# Altium footprint library NRF91.PcbLib: 113 footprints (part 4 of 8)
Each footprint in its own frame and in the unit in brackets; x right, y up, seen from the top. Pads: shape width x height; smd on the part's side, far side on the other; paste and mask are expansions set on the pad; w line width, h text height; cw(c..) or ccw(c..) is an arc to the next point about the centre after c.
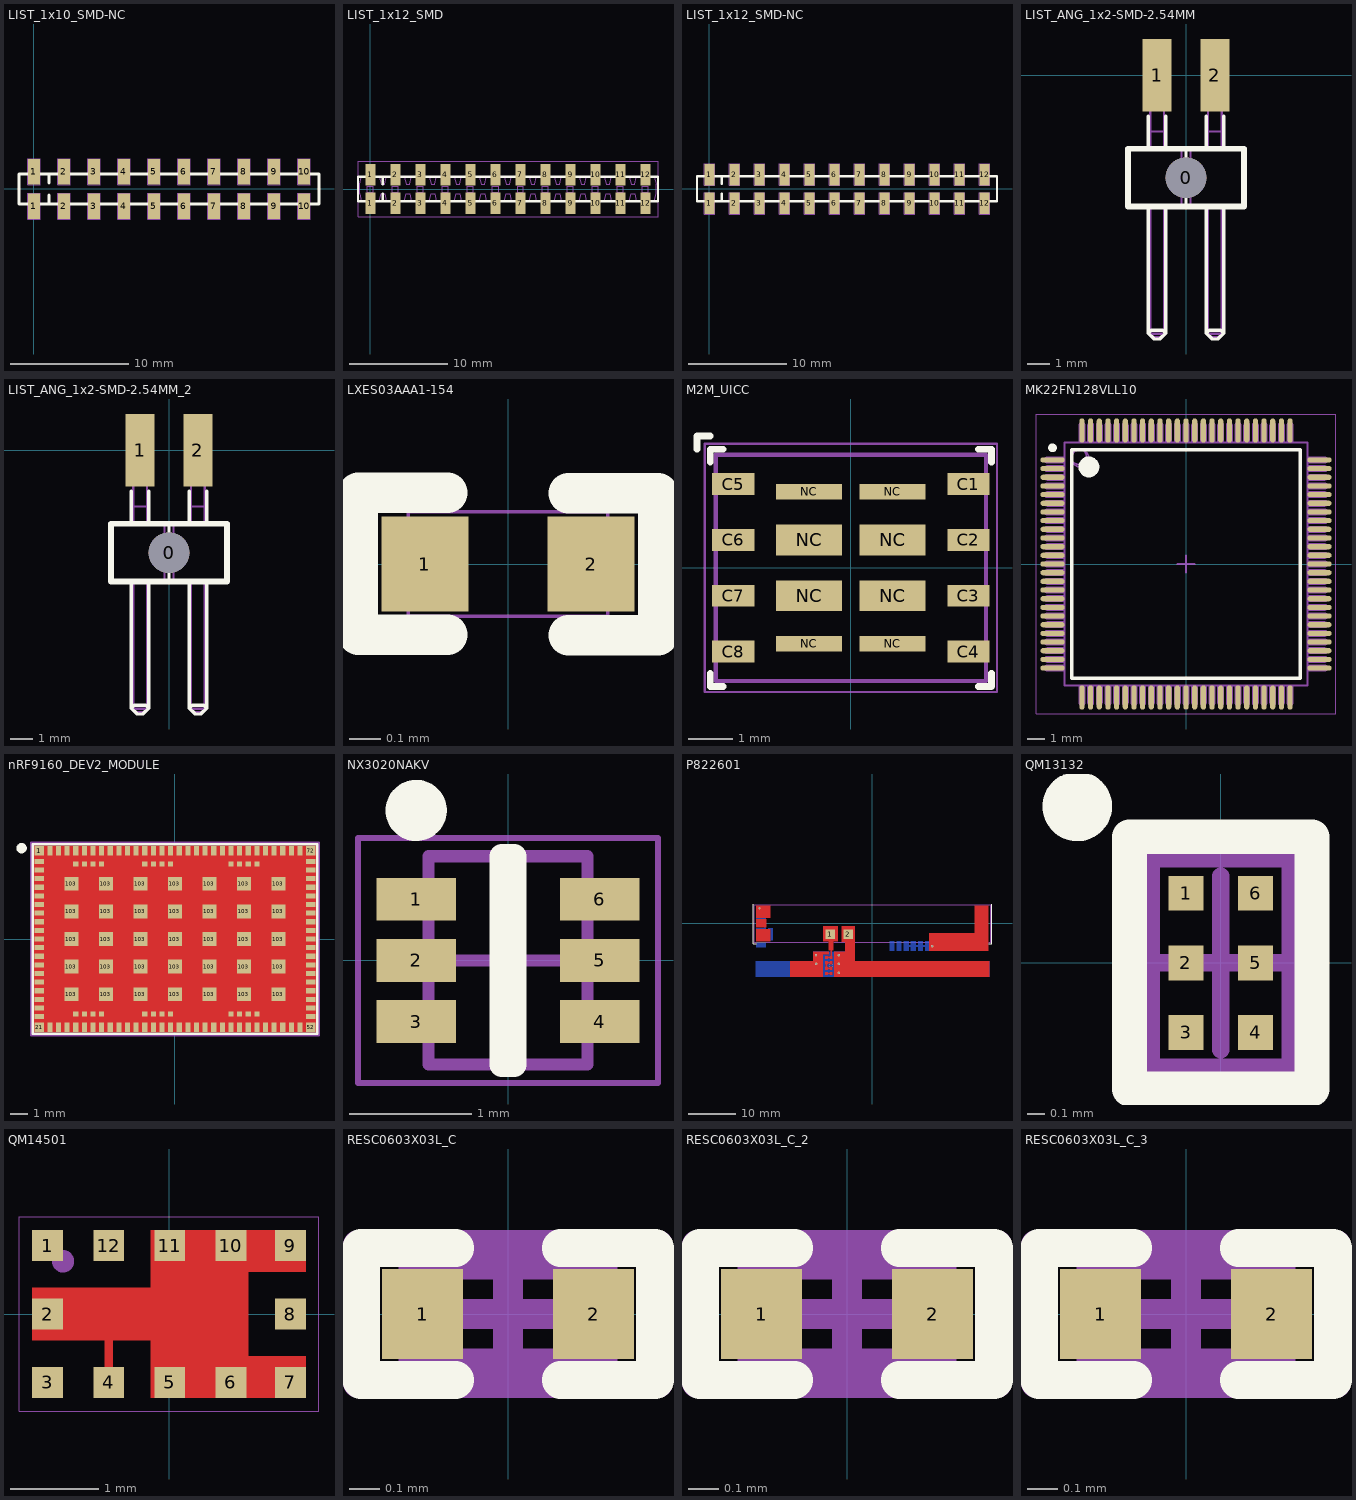
[diagram p3: the footprints below, top view; thin cyan lines are the x and y axes]

## LIST_1x10_SMD-NC [mm]
pads (20):
  rect 1.02x2.19 smd: 1(0,-1.465) 1(0,1.465) 2(2.54,-1.465) 2(2.54,1.465) 3(5.08,-1.465) 3(5.08,1.465) 4(7.62,-1.465) 4(7.62,1.465) 5(10.16,-1.465) 5(10.16,1.465) 6(12.7,-1.465) 6(12.7,1.465) 7(15.24,-1.465) 7(15.24,1.465) 8(17.78,-1.465) 8(17.78,1.465) 9(20.32,-1.465) 9(20.32,1.465) 10(22.86,-1.465) 10(22.86,1.465)
Top Overlay:
  lines w0.254: 1.27,-1.27 1.27,-0.508 ; 1.27,0.508 1.27,1.27 ; -1.27,-1.27 24.13,-1.27 24.13,1.27 -1.27,1.27 -1.27,-1.27
Mechanical 7:
  lines w0.1: -0.686,-1.27 -1.27,-1.27 -1.27,1.27 -0.686,1.27 ; 0.686,-1.27 1.854,-1.27 ; 0.686,1.27 1.854,1.27 ; 1.27,-1.27 1.27,-0.508 ; 1.27,0.508 1.27,1.27 ; 3.226,-1.27 4.394,-1.27 ; 3.226,1.27 4.394,1.27 ; 5.766,-1.27 6.934,-1.27 ; 5.766,1.27 6.934,1.27 ; 8.306,-1.27 9.474,-1.27 ; 8.306,1.27 9.474,1.27 ; 10.846,-1.27 12.014,-1.27 ; 10.846,1.27 12.014,1.27 ; 13.386,-1.27 14.554,-1.27 ; 13.386,1.27 14.554,1.27 ; 15.926,-1.27 17.094,-1.27 ; 15.926,1.27 17.094,1.27 ; 18.466,-1.27 19.634,-1.27 ; 18.466,1.27 19.634,1.27 ; 21.006,-1.27 22.174,-1.27 ; 21.006,1.27 22.174,1.27 ; 23.546,-1.27 24.13,-1.27 24.13,1.27 23.546,1.27 ; -0.51,-2.56 0.51,-2.56 0.51,-0.37 -0.51,-0.37 -0.51,-2.56 ; -0.51,0.37 -0.51,2.56 0.51,2.56 0.51,0.37 -0.51,0.37 ; 2.03,-2.56 3.05,-2.56 3.05,-0.37 2.03,-0.37 2.03,-2.56 ; 2.03,0.37 3.05,0.37 3.05,2.56 2.03,2.56 2.03,0.37 ; 4.57,-2.56 5.59,-2.56 5.59,-0.37 4.57,-0.37 4.57,-2.56 ; 4.57,0.37 5.59,0.37 5.59,2.56 4.57,2.56 4.57,0.37 ; 7.11,-2.56 8.13,-2.56 8.13,-0.37 7.11,-0.37 7.11,-2.56 ; 7.11,0.37 8.13,0.37 8.13,2.56 7.11,2.56 7.11,0.37 ; 9.65,-2.56 10.67,-2.56 10.67,-0.37 9.65,-0.37 9.65,-2.56 ; 9.65,0.37 10.67,0.37 10.67,2.56 9.65,2.56 9.65,0.37 ; 12.19,-2.56 13.21,-2.56 13.21,-0.37 12.19,-0.37 12.19,-2.56 ; 12.19,0.37 13.21,0.37 13.21,2.56 12.19,2.56 12.19,0.37 ; 14.73,-2.56 15.75,-2.56 15.75,-0.37 14.73,-0.37 14.73,-2.56 ; 14.73,0.37 15.75,0.37 15.75,2.56 14.73,2.56 14.73,0.37 ; 17.27,-2.56 18.29,-2.56 18.29,-0.37 17.27,-0.37 17.27,-2.56 ; 17.27,0.37 18.29,0.37 18.29,2.56 17.27,2.56 17.27,0.37 ; 19.81,-2.56 19.81,-0.37 20.83,-0.37 20.83,-2.56 19.81,-2.56 ; 19.81,0.37 19.81,2.56 20.83,2.56 20.83,0.37 19.81,0.37 ; 22.35,-2.56 22.35,-0.37 23.37,-0.37 23.37,-2.56 22.35,-2.56 ; 22.35,0.37 22.35,2.56 23.37,2.56 23.37,0.37 22.35,0.37
  text ".Designator" at 0.5,-0.2 h0.38

## LIST_1x12_SMD [mm]
pads (24):
  rect 1.02x2.19 smd: 1(0,-1.465) 1(0,1.465) 2(2.54,-1.465) 2(2.54,1.465) 3(5.08,-1.465) 3(5.08,1.465) 4(7.62,-1.465) 4(7.62,1.465) 5(10.16,-1.465) 5(10.16,1.465) 6(12.7,-1.465) 6(12.7,1.465) 7(15.24,-1.465) 7(15.24,1.465) 8(17.78,-1.465) 8(17.78,1.465) 9(20.32,-1.465) 9(20.32,1.465) 10(22.86,-1.465) 10(22.86,1.465) 11(25.4,-1.465) 11(25.4,1.465) 12(27.94,-1.465) 12(27.94,1.465)
Top Overlay:
  lines w0.254: 1.27,-1.27 1.27,-0.508 ; 1.27,0.508 1.27,1.27 ; -1.27,-1.27 29.21,-1.27 29.21,1.27 -1.27,1.27 -1.27,-1.27
Mechanical 7:
  drawing of 180 lines, arcs and shapes, not listed
  text ".Designator" at 0.5,-0.2 h0.38
Mechanical 15:
  lines w0.127: -1.27,-2.8 -1.27,2.8 29.21,2.8 29.21,-2.8 -1.27,-2.8
3D body "pin_header_a-sl254-eg-g12mp1.stp": height 9.82, standoff -0.02, extent -1.27,-2.5 29.21,2.5

## LIST_1x12_SMD-NC [mm]
pads (24):
  rect 1.02x2.19 smd: 1(0,-1.465) 1(0,1.465) 2(2.54,-1.465) 2(2.54,1.465) 3(5.08,-1.465) 3(5.08,1.465) 4(7.62,-1.465) 4(7.62,1.465) 5(10.16,-1.465) 5(10.16,1.465) 6(12.7,-1.465) 6(12.7,1.465) 7(15.24,-1.465) 7(15.24,1.465) 8(17.78,-1.465) 8(17.78,1.465) 9(20.32,-1.465) 9(20.32,1.465) 10(22.86,-1.465) 10(22.86,1.465) 11(25.4,-1.465) 11(25.4,1.465) 12(27.94,-1.465) 12(27.94,1.465)
Top Overlay:
  lines w0.254: 1.27,-1.27 1.27,-0.508 ; 1.27,0.508 1.27,1.27 ; -1.27,-1.27 29.21,-1.27 29.21,1.27 -1.27,1.27 -1.27,-1.27
Mechanical 7:
  lines w0.1: -0.686,-1.27 -1.27,-1.27 -1.27,1.27 -0.686,1.27 ; 0.686,-1.27 1.854,-1.27 ; 0.686,1.27 1.854,1.27 ; 1.27,-1.27 1.27,-0.508 ; 1.27,0.508 1.27,1.27 ; 3.226,-1.27 4.394,-1.27 ; 3.226,1.27 4.394,1.27 ; 5.766,-1.27 6.934,-1.27 ; 5.766,1.27 6.934,1.27 ; 8.306,-1.27 9.474,-1.27 ; 8.306,1.27 9.474,1.27 ; 10.846,-1.27 12.014,-1.27 ; 10.846,1.27 12.014,1.27 ; 13.386,-1.27 14.554,-1.27 ; 13.386,1.27 14.554,1.27 ; 15.926,-1.27 17.094,-1.27 ; 15.926,1.27 17.094,1.27 ; 18.466,-1.27 19.634,-1.27 ; 18.466,1.27 19.634,1.27 ; 21.006,-1.27 22.174,-1.27 ; 21.006,1.27 22.174,1.27 ; 23.546,-1.27 24.714,-1.27 ; 23.546,1.27 24.714,1.27 ; 26.086,-1.27 27.254,-1.27 ; 26.086,1.27 27.254,1.27 ; 28.626,-1.27 29.21,-1.27 29.21,1.27 28.626,1.27 ; -0.51,-2.56 0.51,-2.56 0.51,-0.37 -0.51,-0.37 -0.51,-2.56 ; -0.51,0.37 -0.51,2.56 0.51,2.56 0.51,0.37 -0.51,0.37 ; 2.03,-2.56 3.05,-2.56 3.05,-0.37 2.03,-0.37 2.03,-2.56 ; 2.03,0.37 3.05,0.37 3.05,2.56 2.03,2.56 2.03,0.37 ; 4.57,-2.56 5.59,-2.56 5.59,-0.37 4.57,-0.37 4.57,-2.56 ; 4.57,0.37 5.59,0.37 5.59,2.56 4.57,2.56 4.57,0.37 ; 7.11,-2.56 8.13,-2.56 8.13,-0.37 7.11,-0.37 7.11,-2.56 ; 7.11,0.37 8.13,0.37 8.13,2.56 7.11,2.56 7.11,0.37 ; 9.65,-2.56 10.67,-2.56 10.67,-0.37 9.65,-0.37 9.65,-2.56 ; 9.65,0.37 10.67,0.37 10.67,2.56 9.65,2.56 9.65,0.37 ; 12.19,-2.56 13.21,-2.56 13.21,-0.37 12.19,-0.37 12.19,-2.56 ; 12.19,0.37 13.21,0.37 13.21,2.56 12.19,2.56 12.19,0.37 ; 14.73,-2.56 15.75,-2.56 15.75,-0.37 14.73,-0.37 14.73,-2.56 ; 14.73,0.37 15.75,0.37 15.75,2.56 14.73,2.56 14.73,0.37 ; 17.27,-2.56 18.29,-2.56 18.29,-0.37 17.27,-0.37 17.27,-2.56 ; 17.27,0.37 18.29,0.37 18.29,2.56 17.27,2.56 17.27,0.37 ; 19.81,-2.56 19.81,-0.37 20.83,-0.37 20.83,-2.56 19.81,-2.56 ; 19.81,0.37 19.81,2.56 20.83,2.56 20.83,0.37 19.81,0.37 ; 22.35,-2.56 22.35,-0.37 23.37,-0.37 23.37,-2.56 22.35,-2.56 ; 22.35,0.37 22.35,2.56 23.37,2.56 23.37,0.37 22.35,0.37 ; 24.89,-2.56 24.89,-0.37 25.91,-0.37 25.91,-2.56 24.89,-2.56 ; 24.89,0.37 24.89,2.56 25.91,2.56 25.91,0.37 24.89,0.37 ; 27.43,-2.56 27.43,-0.37 28.45,-0.37 28.45,-2.56 27.43,-2.56 ; 27.43,0.37 27.43,2.56 28.45,2.56 28.45,0.37 27.43,0.37
  text ".Designator" at 0.5,-0.2 h0.38

## LIST_ANG_1x2-SMD-2.54MM [mm]
pads (3):
  round 1.78 hole 1.78 unplated: 0(0,-4.496)
  rect 1.27x3.18 smd: 1(-1.27,0) 2(1.27,0)
Top Overlay:
  lines w0.15: -1.651,-5.766 -1.651,-11.324 ; -1.651,-3.226 -1.651,-1.8 ; -0.889,-5.766 -0.889,-11.324 ; -0.889,-3.226 -0.889,-1.8 ; 0,-5.766 0,-3.226 ; 0.889,-5.766 0.889,-11.324 ; 0.889,-3.226 0.889,-1.8 ; 1.651,-5.766 1.651,-11.324 ; 1.651,-3.226 1.651,-1.8 ; -1.651,-11.324 -1.397,-11.578 -1.143,-11.578 -0.889,-11.324 ; -1.651,-11.324 -1.524,-11.197 -1.016,-11.197 -0.889,-11.324 ; 0.889,-11.324 1.143,-11.578 1.397,-11.578 1.651,-11.324 ; 0.889,-11.324 1.016,-11.197 1.524,-11.197 1.651,-11.324
  lines w0.254: -2.54,-5.766 -2.54,-3.226 2.54,-3.226 2.54,-5.766 -2.54,-5.766
Mechanical 7:
  lines w0.1: -1.57,-5.766 -1.57,-11.347 ; -1.57,-3.226 -1.57,0.85 ; -1.57,-2.466 -0.97,-2.466 ; -1.57,-0.464 -0.97,-0.464 ; -0.97,-5.766 -0.97,-11.347 ; -0.97,-3.226 -0.97,0.85 ; -0.2,-5.766 -0.2,-3.226 ; 0.2,-5.766 0.2,-3.226 ; 0.97,-5.766 0.97,-11.347 ; 0.97,-3.226 0.97,0.85 ; 0.97,-2.466 1.57,-2.466 ; 0.97,-0.464 1.57,-0.464 ; 1.57,-5.766 1.57,-11.347 ; 1.57,-3.226 1.57,0.85 ; -1.57,-11.347 -0.97,-11.347 ; -1.57,-11.347 -1.42,-11.497 -1.12,-11.497 -0.97,-11.347 ; -1.57,0.85 -0.97,0.85 ; -1.57,0.85 -1.42,1 -1.12,1 -0.97,0.85 ; 0.97,-11.347 1.57,-11.347 ; 0.97,-11.347 1.12,-11.497 1.42,-11.497 1.57,-11.347 ; 0.97,0.85 1.57,0.85 ; 0.97,0.85 1.12,1 1.42,1 1.57,0.85 ; -2.54,-5.766 -2.54,-3.226 2.54,-3.226 2.54,-5.766 -2.54,-5.766
  text ".Designator" at -2,-4.7 h0.38
3D body "Samtec-TSM-102-01-L-SH-A.step": height 3.03, standoff -1.41, extent -2.56,-11.605 2.52,1.349

## LIST_ANG_1x2-SMD-2.54MM_2 [mm]
pads (3):
  round 1.78 hole 1.78 unplated: 0(0,-4.496)
  rect 1.27x3.18 smd: 1(-1.27,0) 2(1.27,0)
Top Overlay:
  lines w0.15: -1.651,-5.766 -1.651,-11.324 ; -1.651,-3.226 -1.651,-1.8 ; -0.889,-5.766 -0.889,-11.324 ; -0.889,-3.226 -0.889,-1.8 ; 0,-5.766 0,-3.226 ; 0.889,-5.766 0.889,-11.324 ; 0.889,-3.226 0.889,-1.8 ; 1.651,-5.766 1.651,-11.324 ; 1.651,-3.226 1.651,-1.8 ; -1.651,-11.324 -1.524,-11.197 -1.016,-11.197 -0.889,-11.324 ; -1.651,-11.324 -1.397,-11.578 -1.143,-11.578 -0.889,-11.324 ; 0.889,-11.324 1.016,-11.197 1.524,-11.197 1.651,-11.324 ; 0.889,-11.324 1.143,-11.578 1.397,-11.578 1.651,-11.324
  lines w0.254: -2.54,-5.766 2.54,-5.766 2.54,-3.226 -2.54,-3.226 -2.54,-5.766
Mechanical 7:
  lines w0.1: -1.57,-5.766 -1.57,-11.347 ; -1.57,-3.226 -1.57,0.85 ; -1.57,-2.466 -0.97,-2.466 ; -1.57,-0.464 -0.97,-0.464 ; -0.97,-5.766 -0.97,-11.347 ; -0.97,-3.226 -0.97,0.85 ; -0.2,-5.766 -0.2,-3.226 ; 0.2,-5.766 0.2,-3.226 ; 0.97,-5.766 0.97,-11.347 ; 0.97,-3.226 0.97,0.85 ; 0.97,-2.466 1.57,-2.466 ; 0.97,-0.464 1.57,-0.464 ; 1.57,-5.766 1.57,-11.347 ; 1.57,-3.226 1.57,0.85 ; -1.57,-11.347 -1.42,-11.497 -1.12,-11.497 -0.97,-11.347 ; -1.57,-11.347 -0.97,-11.347 ; -1.57,0.85 -1.42,1 -1.12,1 -0.97,0.85 ; -1.57,0.85 -0.97,0.85 ; 0.97,-11.347 1.12,-11.497 1.42,-11.497 1.57,-11.347 ; 0.97,-11.347 1.57,-11.347 ; 0.97,0.85 1.12,1 1.42,1 1.57,0.85 ; 0.97,0.85 1.57,0.85 ; -2.54,-5.766 2.54,-5.766 2.54,-3.226 -2.54,-3.226 -2.54,-5.766
  text ".Designator" at -2,-4.7 h0.38
3D body "Samtec-TSM-102-01-L-SH-A.step": height 3.03, standoff -1.41, extent -2.56,-11.605 2.52,1.349

## LXES03AAA1-154 [mm]
pads (2):
  rect 0.275x0.3 smd: 1(-0.262,0) 2(0.262,0)
Top Overlay:
  lines w0.127: -0.192,0.225 -0.474,0.225 -0.474,-0.224 -0.191,-0.224 ; 0.191,0.224 0.473,0.224 0.474,-0.225 0.192,-0.225
Mechanical 5:
  text ".Comment" at -0.288,-0.075 h0.15
Mechanical 7:
  lines w0.01: -0.315,-0.165 0.315,-0.165 0.315,0.165 -0.315,0.165 -0.315,-0.165
  text ".Designator" at -0.288,-0.075 h0.15
Mechanical 15:
  lines w0.01: -0.315,-0.165 0.315,-0.165 0.315,0.165 -0.315,0.165 -0.315,-0.165
3D body "RES0201.step": height 0.23, standoff 0, extent -0.315,-0.165 0.315,0.165

## M2M_UICC [mm]
pads (16):
  rect 0.96x0.5 smd: C1(2.675,1.905) C2(2.675,0.635) C3(2.675,-0.635) C4(2.675,-1.905) C5(-2.675,1.905) C6(-2.675,0.635) C7(-2.675,-0.635) C8(-2.675,-1.905)
  rect 1.5x0.7 smd: NC(-0.95,-0.635) NC(-0.95,0.635) NC(0.95,-0.635) NC(0.95,0.635)
  rect 1.5x0.35 smd: NC(-0.95,-1.73) NC(-0.95,1.73) NC(0.95,-1.73) NC(0.95,1.73)
Top Overlay:
  lines w0.15: -3.5,2.7 -3.5,3 -3.2,3 ; -3.2,-2.4 -3.2,-2.7 -2.9,-2.7 ; -3.2,2.4 -3.2,2.7 -2.9,2.7 ; 2.9,-2.7 3.2,-2.7 3.2,-2.4 ; 2.9,2.7 3.2,2.7 3.2,2.4
Mechanical 7:
  lines w0.1: -3.075,-2.575 -3.075,2.575 3.075,2.575 3.075,-2.575 -3.075,-2.575
Mechanical 15:
  circle w0.2: c-2.4,1.9 r0.05
  lines w0.05: -3.325,-2.825 -3.325,2.825 3.325,2.825 3.325,-2.825 -3.325,-2.825

## MK22FN128VLL10 [mm]
pads (100):
  oval 1.4x0.3 smd: 1(-7.7,6) 2(-7.7,5.5) 3(-7.7,5) 4(-7.7,4.5) 5(-7.7,4) 6(-7.7,3.5) 7(-7.7,3) 8(-7.7,2.5) 9(-7.7,2) 10(-7.7,1.5) 11(-7.7,1) 12(-7.7,0.5) 13(-7.7,0) 14(-7.7,-0.5) 15(-7.7,-1) 16(-7.7,-1.5) 17(-7.7,-2) 18(-7.7,-2.5) 19(-7.7,-3) 20(-7.7,-3.5) 21(-7.7,-4) 22(-7.7,-4.5) 23(-7.7,-5) 24(-7.7,-5.5) 25(-7.7,-6) 51(7.7,-6) 52(7.7,-5.5) 53(7.7,-5) 54(7.7,-4.5) 55(7.7,-4) 56(7.7,-3.5) 57(7.7,-3) 58(7.7,-2.5) 59(7.7,-2) 60(7.7,-1.5) 61(7.7,-1) 62(7.7,-0.5) 63(7.7,0) 64(7.7,0.5) 65(7.7,1) 66(7.7,1.5) 67(7.7,2) 68(7.7,2.5) 69(7.7,3) 70(7.7,3.5) 71(7.7,4) 72(7.7,4.5) 73(7.7,5) 74(7.7,5.5) 75(7.7,6)
  oval 0.3x1.4 smd: 26(-6,-7.7) 27(-5.5,-7.7) 28(-5,-7.7) 29(-4.5,-7.7) 30(-4,-7.7) 31(-3.5,-7.7) 32(-3,-7.7) 33(-2.5,-7.7) 34(-2,-7.7) 35(-1.5,-7.7) 36(-1,-7.7) 37(-0.5,-7.7) 38(0,-7.7) 39(0.5,-7.7) 40(1,-7.7) 41(1.5,-7.7) 42(2,-7.7) 43(2.5,-7.7) 44(3,-7.7) 45(3.5,-7.7) 46(4,-7.7) 47(4.5,-7.7) 48(5,-7.7) 49(5.5,-7.7) 50(6,-7.7) 76(6,7.7) 77(5.5,7.7) 78(5,7.7) 79(4.5,7.7) 80(4,7.7) 81(3.5,7.7) 82(3,7.7) 83(2.5,7.7) 84(2,7.7) 85(1.5,7.7) 86(1,7.7) 87(0.5,7.7) 88(0,7.7) 89(-0.5,7.7) 90(-1,7.7) 91(-1.5,7.7) 92(-2,7.7) 93(-2.5,7.7) 94(-3,7.7) 95(-3.5,7.7) 96(-4,7.7) 97(-4.5,7.7) 98(-5,7.7) 99(-5.5,7.7) 100(-6,7.7)
Top Overlay:
  circle w0.6: c-5.6,5.6 r0.3
  circle w0.25: c-7.7,6.7 r0.125
  lines w0.2: -6.6,-6.6 6.6,-6.6 6.6,6.6 -6.6,6.6 -6.6,-6.6
Mechanical 7:
  drawing of 405 lines, arcs and shapes, not listed
Mechanical 13:
  circle w0.1: c-6.1,6.1 r0.5
  lines w0.1: -7,-7 7,-7 7,7 -7,7 -7,-7
Mechanical 15:
  lines w0.05: -8.65,-8.65 8.65,-8.65 8.65,8.65 -8.65,8.65 -8.65,-8.65
  lines w0.1: -0.5,0 0.5,0 ; 0,-0.5 0,0.5
3D body "MK22FN128VLL10.step": height 1.7, standoff 0, extent -8,-8 8,8

## nRF9160_DEV2_MODULE [mm]
pads (161):
  rect 0.54x0.54 smd mask+0.05: 1(-7.87,5.12) 21(-7.87,-5.12) 52(7.87,-5.12) 72(7.87,5.12)
  rect 0.54x0.3 smd mask+0.05: 2(-7.87,4.5) 3(-7.87,4) 4(-7.87,3.5) 5(-7.87,3) 6(-7.87,2.5) 7(-7.87,2) 8(-7.87,1.5) 9(-7.87,1) 10(-7.87,0.5) 11(-7.87,0) 12(-7.87,-0.5) 13(-7.87,-1) 14(-7.87,-1.5) 15(-7.87,-2) 16(-7.87,-2.5) 17(-7.87,-3) 18(-7.87,-3.5) 19(-7.87,-4) 20(-7.87,-4.5) 53(7.87,-4.5) 54(7.87,-4) 55(7.87,-3.5) 56(7.87,-3) 57(7.87,-2.5) 58(7.87,-2) 59(7.87,-1.5) 60(7.87,-1) 61(7.87,-0.5) 62(7.87,0) 63(7.87,0.5) 64(7.87,1) 65(7.87,1.5) 66(7.87,2) 67(7.87,2.5) 68(7.87,3) 69(7.87,3.5) 70(7.87,4) 71(7.87,4.5)
  rect 0.3x0.54 smd mask+0.05: 22(-7.25,-5.12) 23(-6.75,-5.12) 24(-6.25,-5.12) 25(-5.75,-5.12) 26(-5.25,-5.12) 27(-4.75,-5.12) 28(-4.25,-5.12) 29(-3.75,-5.12) 30(-3.25,-5.12) 31(-2.75,-5.12) 32(-2.25,-5.12) 33(-1.75,-5.12) 34(-1.25,-5.12) 35(-0.75,-5.12) 36(-0.25,-5.12) 37(0.25,-5.12) 38(0.75,-5.12) 39(1.25,-5.12) 40(1.75,-5.12) 41(2.25,-5.12) 42(2.75,-5.12) 43(3.25,-5.12) 44(3.75,-5.12) 45(4.25,-5.12) 46(4.75,-5.12) 47(5.25,-5.12) 48(5.75,-5.12) 49(6.25,-5.12) 50(6.75,-5.12) 51(7.25,-5.12) 73(7.25,5.12) 74(6.75,5.12) 75(6.25,5.12) 76(5.75,5.12) 77(5.25,5.12) 78(4.75,5.12) 79(4.25,5.12) 80(3.75,5.12) 81(3.25,5.12) 82(2.75,5.12) 83(2.25,5.12) 84(1.75,5.12) 85(1.25,5.12) 86(0.75,5.12) 87(0.25,5.12) 88(-0.25,5.12) 89(-0.75,5.12) 90(-1.25,5.12) 91(-1.75,5.12) 92(-2.25,5.12) 93(-2.75,5.12) 94(-3.25,5.12) 95(-3.75,5.12) 96(-4.25,5.12) 97(-4.75,5.12) 98(-5.25,5.12) 99(-5.75,5.12) 100(-6.25,5.12) 101(-6.75,5.12) 102(-7.25,5.12)
  rect 0.8x0.8 smd mask+0.05: 103(-6,-3.2) 103(-6,-1.6) 103(-6,0) 103(-6,1.6) 103(-6,3.2) 103(-4,-3.2) 103(-4,-1.6) 103(-4,0) 103(-4,1.6) 103(-4,3.2) 103(-2,-3.2) 103(-2,-1.6) 103(-2,0) 103(-2,1.6) 103(-2,3.2) 103(0,-3.2) 103(0,-1.6) 103(0,0) 103(0,1.6) 103(0,3.2) 103(2,-3.2) 103(2,-1.6) 103(2,0) 103(2,1.6) 103(2,3.2) 103(4,-3.2) 103(4,-1.6) 103(4,0) 103(4,1.6) 103(4,3.2) 103(6,-3.2) 103(6,-1.6) 103(6,0) 103(6,1.6) 103(6,3.2)
  rect 0.3x0.3 smd mask+0.05: 104(-5.75,-4.35) 105(-5.25,-4.35) 106(-4.75,-4.35) 107(-4.25,-4.35) 108(-1.75,-4.35) 109(-1.25,-4.35) 110(-0.75,-4.35) 111(-0.25,-4.35) 112(3.25,-4.35) 113(3.75,-4.35) 114(4.25,-4.35) 115(4.75,-4.35) 116(4.75,4.35) 117(4.25,4.35) 118(3.75,4.35) 119(3.25,4.35) 120(-0.25,4.35) 121(-0.75,4.35) 122(-1.25,4.35) 123(-1.75,4.35) 124(-4.25,4.35) 125(-4.75,4.35) 126(-5.25,4.35) 127(-5.75,4.35)
Top Layer:
  pour cut-out: -8.15,5.4 8.15,5.4 8.15,-5.4 -8.15,-5.4
Top Overlay:
  circle w0.3: c-8.89,5.265 r0.15
  lines w0.15: -8.25,-5.5 8.25,-5.5 8.25,5.5 -8.25,5.5 -8.25,-5.5
Mechanical 5:
  text ".Comment" at -5.4,-2.45 h0.9
Mechanical 7:
  circle w0.3: c-6.5,3.75 r0.15
  lines w0.1: -8.05,-5.3 8.05,-5.3 8.05,5.3 -8.05,5.3 -8.05,-5.3
  text ".Designator" at -0.878,-0.289 h1.5
Mechanical 15:
  circle w0.3: c-6.5,3.75 r0.15
  lines w0.1: -8.35,-5.6 8.35,-5.6 8.35,5.6 -8.35,5.6 -8.35,-5.6
3D body "nRF9160_v4.step": height 1.2, standoff 0, extent -8.05,-5.3 8.05,5.3
3D body: height 2.65, standoff -2.65, extent 13.7,-4.35 13.7,-4.35

## NX3020NAKV [mm]
pads (6):
  rect 0.65x0.35 smd: 1(-0.75,0.5) 2(-0.75,0) 3(-0.75,-0.5) 4(0.75,-0.5) 5(0.75,0) 6(0.75,0.5)
Top Overlay:
  circle w0.25: c-0.75,1.225 r0.125
  lines w0.2: -0.05,-0.85 0.05,-0.85 0.05,0.85 -0.05,0.85 -0.05,-0.85
Mechanical 13:
  lines w0.1: -0.65,-0.85 -0.65,0.85 0.65,0.85 0.65,-0.85 -0.65,-0.85
Mechanical 15:
  lines w0.05: -1.225,-1 -1.225,1 1.225,1 1.225,-1 -1.225,-1
  lines w0.1: -0.5,0 0.5,0 ; 0,-0.5 0,0.5
3D body "NX3020NAKV2.step": height 0.6, standoff 0, extent -0.8,-0.848 0.8,0.848

## P822601 [mm]
pads (2):
  rect 2x2 smd: 1(-8.89,-2.286) 2(-5.08,-2.286)
via -11.886,-6.746 diameter 0.5 hole 0.25
via -7.05,-6.746 diameter 0.5 hole 0.25
via -23.85,3.254 diameter 0.5 hole 0.25
via 12.7,-4.796 diameter 0.5 hole 0.25
via -11.84,-8.55 diameter 0.5 hole 0.25
via -7.05,-8.55 diameter 0.5 hole 0.25
via -7.05,-10.466 diameter 0.5 hole 0.25
Top Layer:
  region: -21.6,1.254 -24.5,1.254 -24.5,3.754 -21.6,3.754
  region: -22.4,-0.846 -24.5,-0.846 -24.5,0.854 -22.4,0.854
  region: -21.6,-3.746 -24.5,-3.746 -24.5,-1.246 -21.6,-1.246
  region: 24.6,-5.796 12.05,-5.796 12.05,-2.046 24.6,-2.046
  region: 24.6,-2.046 21.7,-2.046 21.7,3.754 24.6,3.754
  region: -3.67,-7.991 -8.05,-7.991 -8.05,-5.996 -3.67,-5.996
  region: -3.67,-5.996 -5.71,-5.996 -5.71,-3.826 -3.67,-3.826
  region: -3.67,-3.826 -6.399,-3.826 -6.4,-0.566 -3.67,-0.566
  region: -10.45,-7.996 -12.45,-7.996 -12.45,-6.496 -10.45,-6.496
  region: -9.2,-6.496 -12.45,-6.496 -12.45,-5.996 -9.2,-5.996
  region: -9.45,-7.496 -9.95,-7.496 -9.95,-7.296 -9.45,-7.296
  region: -8.45,-7.496 -8.95,-7.496 -8.95,-7.296 -8.45,-7.296
  region: -8.45,-7.296 -9.95,-7.296 -9.95,-7.096 -8.45,-7.096
  region: -9.45,-7.096 -9.95,-7.096 -9.95,-6.896 -9.45,-6.896
  region: -8.45,-7.096 -8.95,-7.096 -8.95,-6.896 -8.45,-6.896
  region: -8.6,-6.896 -8.8,-6.896 -8.8,-5.696 -8.6,-5.696
  region: -8.2,-5.696 -9.2,-5.696 -9.2,-3.796 -8.2,-3.796
  region: -7.3,-3.796 -10.4,-3.796 -10.4,-0.596 -7.3,-0.596
  region: -9.45,-9.796 -9.95,-9.796 -9.95,-9.596 -9.45,-9.596
  region: -8.45,-9.796 -8.95,-9.796 -8.95,-9.596 -8.45,-9.596
  region: -8.45,-9.596 -9.95,-9.596 -9.95,-9.396 -8.45,-9.396
  region: -9.45,-9.396 -9.95,-9.396 -9.95,-9.196 -9.45,-9.196
  region: -8.45,-9.396 -8.95,-9.396 -8.95,-9.196 -8.45,-9.196
  region: -9.6,-9.196 -9.8,-9.196 -9.8,-8.596 -9.6,-8.596
  region: -9.45,-8.596 -9.95,-8.596 -9.95,-8.396 -9.45,-8.396
  region: -8.45,-8.596 -8.95,-8.596 -8.95,-8.396 -8.45,-8.396
  region: -8.45,-8.396 -9.95,-8.396 -9.95,-8.196 -8.45,-8.196
  region: -9.45,-8.196 -9.95,-8.196 -9.95,-7.996 -9.45,-7.996
  region: -8.45,-8.196 -8.95,-8.196 -8.95,-7.996 -8.45,-7.996
  region: -9.45,-10.896 -9.95,-10.896 -9.95,-10.696 -9.45,-10.696
  region: -8.45,-10.896 -8.95,-10.896 -8.95,-10.696 -8.45,-10.696
  region: -8.45,-10.696 -9.95,-10.696 -9.95,-10.496 -8.45,-10.496
  region: -9.45,-10.496 -9.95,-10.496 -9.95,-10.296 -9.45,-10.296
  region: -8.45,-10.496 -8.95,-10.496 -8.95,-10.296 -8.45,-10.296
  region: 24.75,-11.296 -8.05,-11.296 -8.05,-8.001 24.75,-8.001
  region: -10.45,-11.296 -17.323,-11.296 -17.323,-7.996 -10.45,-7.996
Mid-Layer 1:
  pour cut-out: -37.084,4.72 26.416,4.72 26.416,-7.996 -37.084,-7.996
Mid-Layer 2:
  pour cut-out: -37.084,4.72 26.416,4.72 26.416,-7.996 -37.084,-7.996
Bottom Layer:
  region: -22.5,-3.546 -24.5,-3.546 -24.5,-2.546 -22.5,-2.546
  region: -24.196,-2.546 -24.5,-2.546 -24.5,-2.046 -24.196,-2.046
  region: -22.5,-2.046 -24.5,-2.046 -24.5,-1.046 -22.5,-1.046
  region: -22.5,-1.046 -22.8,-1.046 -22.8,-0.546 -22.5,-0.546
  region: -22.5,-0.546 -24.5,-0.546 -24.5,3.754 -22.5,3.754
  region: -21,-3.546 -22,-3.546 -22,-1.046 -21,-1.046
  region: -22.5,-5.046 -24.5,-5.046 -24.5,-4.046 -22.5,-4.046
  region: 7.7,-5.796 6.7,-5.796 6.7,-4.896 7.7,-4.896
  region: 9.2,-5.796 8.2,-5.796 8.2,-4.896 9.2,-4.896
  region: 10.7,-5.796 9.7,-5.796 9.7,-4.896 10.7,-4.896
  region: 13.2,-5.796 11.2,-5.796 11.2,-4.896 13.2,-4.896
  region: 13.2,-4.896 6.7,-4.896 6.7,-4.596 13.2,-4.596
  region: 7.7,-4.596 6.7,-4.596 6.7,-3.746 7.7,-3.746
  region: 9.2,-4.596 8.2,-4.596 8.2,-3.746 9.2,-3.746
  region: 10.7,-4.596 9.7,-4.596 9.7,-3.746 10.7,-3.746
  region: 13.2,-4.596 11.2,-4.596 11.2,-3.746 13.2,-3.746
  region: 6.2,-5.796 5.2,-5.796 5.2,-3.746 6.2,-3.746
  region: 4.7,-5.796 3.7,-5.796 3.7,-3.746 4.7,-3.746
  region: -3.86,-7.996 -12.45,-7.996 -12.45,-5.996 -3.86,-5.996
  region: 24.752,-11.296 -24.648,-11.296 -24.65,-7.996 24.75,-7.996
Top Overlay:
  lines w0.2: -25.2,4.05 -25.2,-4.25 -24.575,-4.25 ; 24.675,-4.25 25.3,-4.25 25.3,4.05
Top Solder:
  region: -21.6,1.254 -24.5,1.254 -24.5,2.654 -21.6,2.654
  region: -21.6,2.654 -23.25,2.654 -23.25,3.737 -21.6,3.737
  region: -22.4,-0.846 -24.5,-0.846 -24.5,0.854 -22.4,0.854
  region: -3.67,-3.746 -6.4,-3.746 -6.4,-0.546 -3.67,-0.546
  region: -7.3,-3.746 -10.4,-3.746 -10.4,-0.596 -7.3,-0.596
  region: -10.45,-7.496 -10.97,-7.496 -10.97,-6.896 -10.45,-6.896
  region: -9.45,-7.496 -9.95,-7.496 -9.95,-6.896 -9.45,-6.896
  region: -8.45,-7.496 -8.95,-7.496 -8.95,-6.896 -8.45,-6.896
  region: -8.45,-8.596 -8.95,-8.596 -8.95,-7.996 -8.45,-7.996
  region: -9.45,-8.596 -9.95,-8.596 -9.95,-7.996 -9.45,-7.996
  region: -10.45,-8.596 -10.97,-8.596 -10.97,-7.996 -10.45,-7.996
  region: -10.45,-9.796 -10.97,-9.796 -10.97,-9.196 -10.45,-9.196
  region: -9.45,-9.785 -9.95,-9.785 -9.95,-9.196 -9.45,-9.196
  region: -8.45,-9.796 -8.95,-9.796 -8.95,-9.196 -8.45,-9.196
  region: -8.45,-10.896 -8.95,-10.896 -8.95,-10.296 -8.45,-10.296
  region: -9.45,-10.896 -9.95,-10.896 -9.95,-10.296 -9.45,-10.296
  region: -10.45,-10.896 -10.97,-10.896 -10.97,-10.296 -10.45,-10.296
  region: 23.5,-3.746 21.7,-3.746 21.7,-2.546 23.5,-2.546
  region: 24.6,-2.546 21.7,-2.546 21.7,-0.546 24.6,-0.546
  region: 23.5,-0.546 21.7,-0.546 21.7,0.554 23.5,0.554
  region: 24.6,0.554 21.7,0.554 21.7,2.554 24.6,2.554
  region: 23.5,2.554 21.7,2.554 21.7,3.754 23.5,3.754
  region: 16.75,-3.746 14.35,-3.746 14.35,-2.546 16.75,-2.546
  region: -21.6,-3.746 -24.5,-3.746 -24.5,-1.246 -21.6,-1.246
Bottom Solder:
  region: 4.7,-5.796 4.1,-5.796 4.1,-5.276 4.7,-5.276
  region: 5.8,-5.796 5.2,-5.796 5.2,-5.276 5.8,-5.276
  region: 6.2,-4.266 5.6,-4.266 5.6,-3.746 6.2,-3.746
  region: 7.3,-4.266 6.7,-4.266 6.7,-3.746 7.3,-3.746
  region: 7.7,-5.796 7.1,-5.796 7.1,-5.271 7.7,-5.271
  region: 8.8,-5.796 8.2,-5.796 8.2,-5.271 8.8,-5.271
  region: 10.7,-5.796 10.1,-5.796 10.1,-5.271 10.7,-5.271
  region: 11.8,-5.796 11.2,-5.796 11.2,-5.271 11.8,-5.271
  region: 9.2,-4.271 8.6,-4.271 8.6,-3.746 9.2,-3.746
  region: 10.3,-4.271 9.7,-4.271 9.7,-3.746 10.3,-3.746
  region: -21.48,-2.046 -22,-2.046 -22,-1.446 -21.48,-1.446
  region: -22.5,-2.046 -23.025,-2.046 -23.025,-1.446 -22.5,-1.446
  region: -22.5,-3.146 -23.025,-3.146 -23.025,-2.546 -22.5,-2.546
  region: -21.48,-3.146 -22,-3.146 -22,-2.546 -21.48,-2.546
  region: -23.975,-3.546 -24.5,-3.546 -24.5,-2.957 -23.975,-2.957
  region: -23.975,-4.646 -24.5,-4.646 -24.5,-4.046 -23.975,-4.046
  region: -23.975,-2.957 -24.5,-2.957 -24.489,-2.946 -23.975,-2.946
  region: -23.975,-1.646 -24.5,-1.646 -24.5,-1.046 -23.975,-1.046
  region: -23.975,-0.546 -24.5,-0.546 -24.5,0.054 -23.975,0.054
Mechanical 15:
  lines w0.254: -24.95,-4.005 25.05,-4.005 25.05,4.004 -24.95,4.004 -24.95,-4.005
3D body: height 3.2, standoff 0, extent -24.95,-4 25.05,4

## QM13132 [mm]
pads (6):
  rect 0.2x0.2 smd paste+0: 1(-0.2,0.4)
  rect 0.2x0.2 smd: 2(-0.2,0) 3(-0.2,-0.4) 4(0.2,-0.4) 5(0.2,0) 6(0.2,0.4)
Top Overlay:
  circle w0.2: c-0.825,0.9 r0.1
  lines w0.2: -0.525,-0.725 0.525,-0.725 0.525,0.725 -0.525,0.725 -0.525,-0.725
Mechanical 7:
  lines w0.1: -0.4,-0.6 -0.4,0.6 0.4,0.6 0.4,-0.6 -0.4,-0.6
  text ".Designator" at 0.125,-0.775 h0.38
Mechanical 15:
  lines w0.1: -0.5,0 0.5,0 ; 0,-0.5 0,0.5
3D body: height 0.5, standoff 0, extent -0.4,-0.6 0.4,0.6

## QM14501 [mm]
pads (12):
  rect 0.35x0.35 smd mask+0.065: 1(-1.375,0.775) 2(-1.375,0) 3(-1.375,-0.775) 4(-0.683,-0.775) 5(0.009,-0.775) 6(0.701,-0.775) 7(1.375,-0.775) 8(1.375,0) 9(1.375,0.775) 10(0.701,0.775) 11(0.009,0.775) 12(-0.683,0.775)
Top Layer:
  rectangle: -0.208,0.474 1.55,0.95
  rectangle: -0.733,-0.6 -0.633,-0.3
  rectangle: -1.55,-0.3 -0.208,0.3
  rectangle: -0.208,-0.474 0.9,0.474
  rectangle: -0.208,-0.95 1.55,-0.474
Top Solder:
  rectangle: -0.273,0.365 1.615,1.015
  rectangle: -0.798,-0.535 -0.568,-0.365
  rectangle: -1.615,-0.367 0.965,0.363
  rectangle: -0.273,-1.015 1.615,-0.365
Mechanical 5:
  text ".Comment" at -0.9,-0.15 h0.3
Mechanical 7:
  circle w0.15: c-1.2,0.6 r0.05
  lines w0.01: -1.7,-1.1 1.7,-1.1 1.7,1.1 -1.7,1.1 -1.7,-1.1
  text ".Designator" at -0.45,-0.15 h0.3
Mechanical 15:
  circle w0.15: c-1.2,0.595 r0.05
  lines w0.01: -1.7,-1.1 1.7,-1.1 1.7,1.1 -1.7,1.1 -1.7,-1.1
3D body: height 1, standoff 0, extent -1.7,-1.1 1.7,1.1
3D body: height 1.01, standoff 1, extent -1.349,0.45 -1.05,0.75

## RESC0603X03L_C [mm]
pads (2):
  rect 0.27x0.3 smd: 1(-0.285,0) 2(0.285,0)
Top Overlay:
  lines w0.125: -0.175,-0.22 -0.49,-0.22 -0.49,0.22 -0.175,0.22 ; 0.175,-0.22 0.49,-0.22 0.49,0.22 0.175,0.22
Mechanical 7:
  lines w0.1: -0.315,-0.165 0.315,-0.165 0.315,0.165 -0.315,0.165 -0.315,-0.165
  text ".Designator" at -0.306,0.268 h0.3
Mechanical 15:
  lines w0.1: -0.165,0 0.165,0 ; 0,-0.165 0,0.165 ; -0.5,-0.23 0.5,-0.23 0.5,0.23 -0.5,0.23 -0.5,-0.23
3D body "User Library-res0201-1.step": height 0.23, standoff 0, extent -0.3,-0.15 0.3,0.15

## RESC0603X03L_C_2 [mm]
pads (2):
  rect 0.27x0.3 smd: 1(-0.285,0) 2(0.285,0)
Top Overlay:
  lines w0.125: -0.175,-0.22 -0.49,-0.22 -0.49,0.22 -0.175,0.22 ; 0.175,-0.22 0.49,-0.22 0.49,0.22 0.175,0.22
Mechanical 7:
  lines w0.1: -0.315,-0.165 0.315,-0.165 0.315,0.165 -0.315,0.165 -0.315,-0.165
  text ".Designator" at -0.306,0.268 h0.3
Mechanical 15:
  lines w0.1: -0.165,0 0.165,0 ; 0,-0.165 0,0.165 ; -0.5,-0.23 0.5,-0.23 0.5,0.23 -0.5,0.23 -0.5,-0.23
3D body "User Library-res0201-1.step": height 0.23, standoff 0, extent -0.3,-0.15 0.3,0.15

## RESC0603X03L_C_3 [mm]
pads (2):
  rect 0.27x0.3 smd: 1(-0.285,0) 2(0.285,0)
Top Overlay:
  lines w0.125: -0.175,-0.22 -0.49,-0.22 -0.49,0.22 -0.175,0.22 ; 0.175,-0.22 0.49,-0.22 0.49,0.22 0.175,0.22
Mechanical 7:
  lines w0.1: -0.315,-0.165 0.315,-0.165 0.315,0.165 -0.315,0.165 -0.315,-0.165
  text ".Designator" at -0.306,0.268 h0.3
Mechanical 15:
  lines w0.1: -0.165,0 0.165,0 ; 0,-0.165 0,0.165 ; -0.5,-0.23 0.5,-0.23 0.5,0.23 -0.5,0.23 -0.5,-0.23
3D body "User Library-res0201-1.step": height 0.23, standoff 0, extent -0.3,-0.15 0.3,0.15